# Altium footprint library Inductor.PcbLib: 75 footprints (part 1 of 5)
Each footprint in its own frame and in the unit in brackets; x right, y up, seen from the top. Pads: shape width x height; smd on the part's side, far side on the other; paste and mask are expansions set on the pad; w line width, h text height; cw(c..) or ccw(c..) is an arc to the next point about the centre after c.
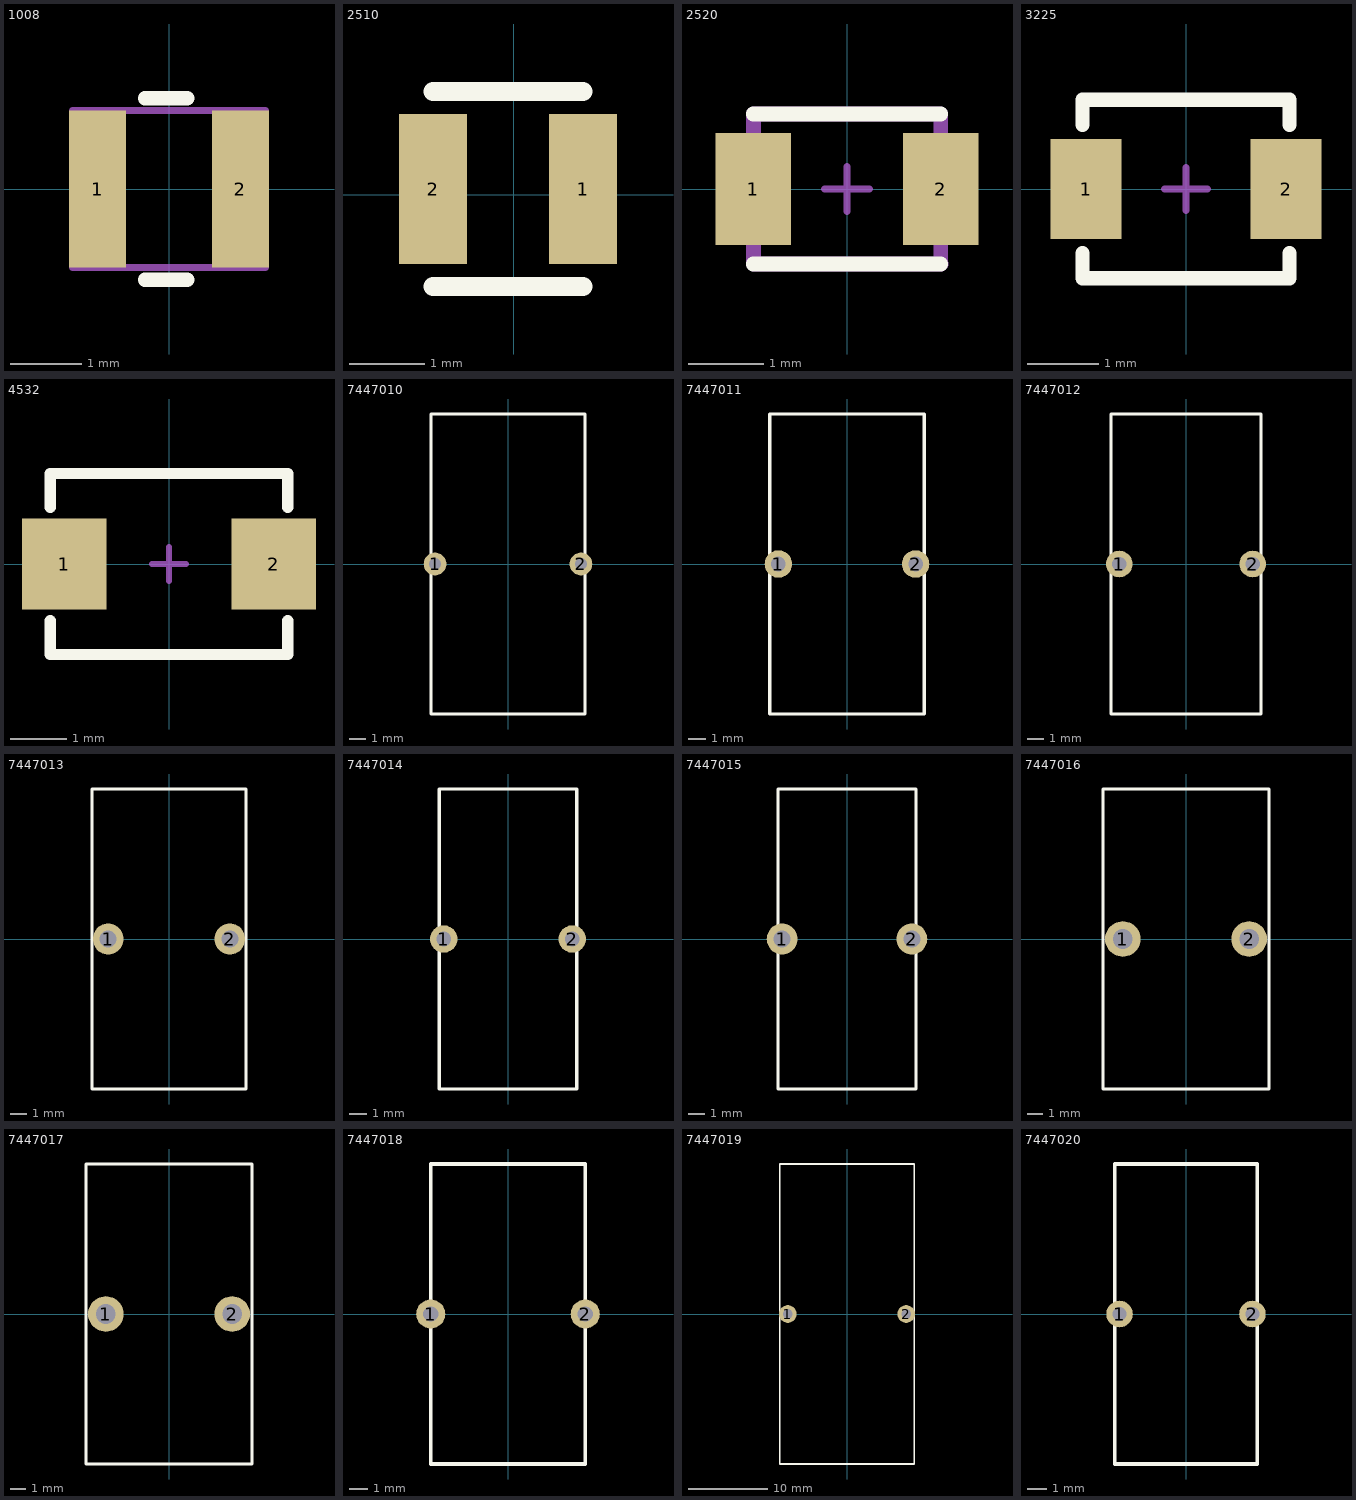
[diagram p0: the footprints below, top view; thin cyan lines are the x and y axes]

## 1008 [mm]
pads (2):
  rect 0.8x2.2 smd: 1(-1,0) 2(1,0)
Top Overlay:
  lines w0.2: -0.335,-1.27 0.254,-1.27 ; -0.335,1.27 0.254,1.27
Mechanical 5:
  lines w0.1: -1.35,-1.1 -1.35,1.1 1.35,1.1 1.35,-1.1 -1.35,-1.1
3D body: height 1.2, standoff 0, extent -1.349,-1.099 -0.551,1.099
3D body: height 1.2, standoff 0, extent 0.551,-1.099 1.349,1.099
3D body: height 1.2, standoff 0, extent -0.549,-1.099 0.549,1.099

## 2510 [mm]
pads (2):
  rect 0.9x2 smd: 1(0.924,0.076) 2(-1.076,0.076)
Top Overlay:
  lines w0.254: -1.076,-1.224 0.924,-1.224 ; -1.076,1.376 0.924,1.376

## 2520 [mm] "SMD High Frequence Inductor, size 2520"
height 1.8
pads (2):
  rect 1x1.5 smd: 1(-1.25,0) 2(1.25,0)
Top Overlay:
  lines w0.2: -1.25,-1 1.25,-1 ; -1.25,1 1.25,1
Mechanical 13:
  lines w0.2: -1.25,1 1.25,1 1.25,-1 ; -1.25,1 -1.25,-1 1.25,-1 ; -1.25,1 -1.25,1 ; 1.25,-1 1.25,-1
Mechanical 15:
  lines w0.1: -0.3,0 0.3,0 ; 0,-0.3 0,0.3
3D body "WE-GFH 2520.stp": height 1.8, standoff 0, extent -1.25,-1 1.25,1

## 3225 [mm] "SMD High Frequence Inductor, size 3225"
height 2.2
pads (2):
  rect 1x1.4 smd: 1(-1.4,0) 2(1.4,0)
Top Overlay:
  lines w0.2: -1.45,-0.9 -1.45,-1.25 1.45,-1.25 1.45,-0.9 ; -1.45,0.9 -1.45,1.25 1.45,1.25 1.45,0.9
Mechanical 15:
  lines w0.1: -0.3,0 0.3,0 ; 0,-0.3 0,0.3
3D body "IndGFH_3225.stp": height 2.22, standoff 0.02, extent -1.68,-1.25 1.68,1.25

## 4532 [mm] "SMD High Frequence Inductor, size 4532"
height 3.2
pads (2):
  rect 1.5x1.6 smd: 1(-1.85,0) 2(1.85,0)
Top Overlay:
  lines w0.2: -2.1,-1 -2.1,-1.6 2.1,-1.6 2.1,-1 ; -2.1,1 -2.1,1.6 2.1,1.6 2.1,1
Mechanical 15:
  lines w0.1: -0.3,0 0.3,0 ; 0,-0.3 0,0.3
3D body "IndGFH_4532.stp": height 3.22, standoff 0.02, extent -2.25,-1.6 2.25,1.6

## 7447010 [mm] "Body 18.5x9.5mm, 2 leads"
height 18.5
pads (2):
  round 1.4 hole 0.75: 1(-4.5,0) 2(4.5,0)
Top Overlay:
  lines w0.2: -4.75,-9.25 -4.75,9.25 4.75,9.25 4.75,-9.25 -4.75,-9.25
3D body "7447010.stp": height 19.9, standoff -14.25, extent -5.42,-9.915 5.42,9.916

## 7447011 [mm] "Body 17.5x9mm, 2 leads"
height 17.5
pads (2):
  round 1.6 hole 0.85: 1(-4,0) 2(4,0)
Top Overlay:
  lines w0.2: -4.5,-8.75 4.5,-8.75 4.5,8.75 -4.5,8.75 -4.5,-8.75
3D body "7447011.stp": height 19.35, standoff -13.75, extent -5.12,-9.365 5.12,9.365

## 7447012 [mm] "Body 18x9mm, 2 leads"
height 18
pads (2):
  round 1.6 hole 0.85: 1(-4,0) 2(4,0)
Top Overlay:
  lines w0.2: -4.5,-9 4.5,-9 4.5,9 -4.5,9 -4.5,-9
3D body "7447012.stp": height 19.6, standoff -14, extent -5.12,-9.614 5.12,9.614

## 7447013 [mm] "Body 18.5x9.5mm, 2 leads"
height 18.5
pads (2):
  round 1.9 hole 1.05: 1(-3.75,0) 2(3.75,0)
Top Overlay:
  lines w0.2: -4.75,-9.25 -4.75,9.25 4.75,9.25 4.75,-9.25 -4.75,-9.25
3D body "7447013.stp": height 20.02, standoff -14.25, extent -5.57,-10.059 5.57,10.058

## 7447014 [mm] "Body 17.5x8mm, 2 leads"
height 17.5
pads (2):
  round 1.6 hole 0.85: 1(-3.75,0) 2(3.75,0)
Top Overlay:
  lines w0.2: -4,-8.75 4,-8.75 4,8.75 -4,8.75 -4,-8.75
3D body "7447014.stp": height 19.35, standoff -13.75, extent -4.62,-9.365 4.62,9.365

## 7447015 [mm] "Body 18.5x8.5mm, 2 leads"
height 18.5
pads (2):
  round 1.9 hole 1.05: 1(-4,0) 2(4,0)
Top Overlay:
  lines w0.2: -4.25,-9.25 -4.25,9.25 4.25,9.25 4.25,-9.25 -4.25,-9.25
3D body "7447015.stp": height 20.02, standoff -14.25, extent -5.07,-10.059 5.07,10.058

## 7447016 [mm] "Body 19x10.5mm, 2 leads"
height 19
pads (2):
  round 2.25 hole 1.25: 1(-4,0) 2(4,0)
Top Overlay:
  lines w0.2: -5.25,-9.5 5.25,-9.5 5.25,9.5 -5.25,9.5 -5.25,-9.5
3D body "7447016.stp": height 17.32, standoff -14.3, extent -4.27,-8.693 4.27,8.694

## 7447017 [mm] "Body 19x10.5mm, 2 leads"
height 19
pads (2):
  round 2.25 hole 1.25: 1(-4,0) 2(4,0)
Top Overlay:
  lines w0.2: -5.25,-9.5 5.25,-9.5 5.25,9.5 -5.25,9.5 -5.25,-9.5
3D body "7447017.stp": height 20.93, standoff -14, extent -6.27,-10.493 6.27,10.497

## 7447018 [mm] "Body 16.5x8.5mm, 2 leads"
height 16.5
pads (2):
  round 1.6 hole 0.85: 1(-4.25,0) 2(4.25,0)
Top Overlay:
  lines w0.2: -4.25,-8.25 -4.25,8.25 4.25,8.25 4.25,-8.25 -4.25,-8.25
3D body "7447018.stp": height 17.87, standoff -14.25, extent -4.87,-8.833 4.87,8.834

## 7447019 [mm] "Body 38x17mm, 2 leads"
height 38
pads (2):
  round 2.25 hole 1.25: 1(-7.5,0) 2(7.5,0)
Top Overlay:
  lines w0.2: -8.5,-19 -8.5,19 8.5,19 8.5,-19 -8.5,-19
3D body "7447019.stp": height 40.49, standoff -13.5, extent -9.52,-20.01 9.52,20.01

## 7447020 [mm] "Body 15.8x7.5mm, 2 leads"
height 15.8
pads (2):
  round 1.4 hole 0.75: 1(-3.5,0) 2(3.5,0)
Top Overlay:
  lines w0.2: -3.75,-7.9 -3.75,7.9 3.75,7.9 3.75,-7.9 -3.75,-7.9
3D body "7447020.stp": height 16.89, standoff -14.4, extent -4.26,-8.405 4.26,8.405